# Altium footprint library Cty1.PcbLib: 870 footprints (part 40 of 55)
Each footprint in its own frame and in the unit in brackets; x right, y up, seen from the top. Pads: shape width x height; smd on the part's side, far side on the other; paste and mask are expansions set on the pad; w line width, h text height; cw(c..) or ccw(c..) is an arc to the next point about the centre after c.
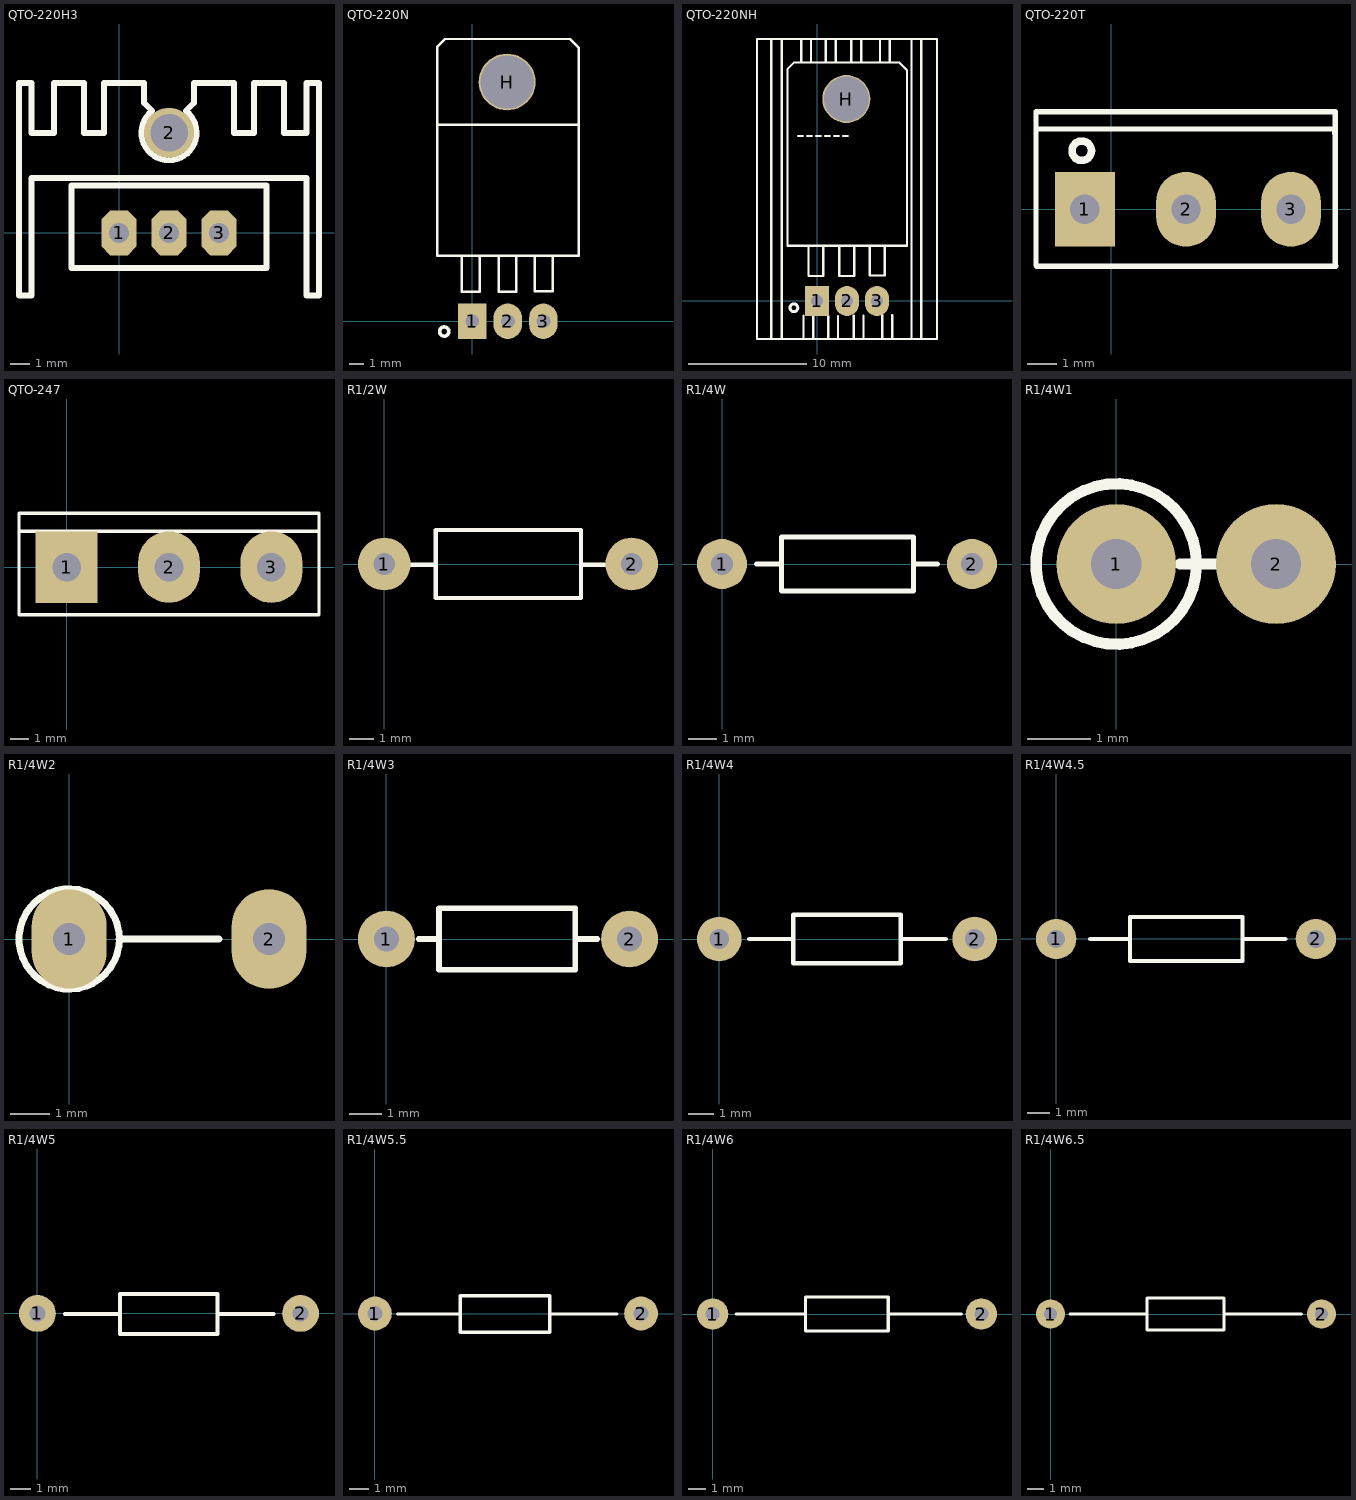
[diagram p39: the footprints below, top view; thin cyan lines are the x and y axes]

## QTO-220H3 [mil] "TO-220 1-2-3"
pads (4):
  oct 70x90 hole 40: 1(0,0) 2(100,0) 3(200,0)
  round 100 hole 75: 2(100,200)
Top Overlay:
  lines w12: 66,244 50,260 50,300 -30,300 -30,200 -70,200 -70,300 -130,300 -130,200 -175,200 -175,300 -200,300 -200,-125 -175,-125 -175,110 375,110 375,-125 400,-125 400,300 375,300 375,200 330,200 330,300 270,300 270,200 230,200 230,300 150,300 150,260 133.59,243.59 ; 66.37,243.52 ccw(c100,200) 133.77,243.41 ; -95,-70 -95,95 295,95 295,-70 -95,-70
3D body "SW3dPS-heatsink TO126.STEP": height 984.25, standoff -149.61, extent -189.97,-102.25 391.97,323
3D body "User Library-TO-220-1.STEP": height 322.83, standoff -810.24, extent -96.88,-76.17 292.88,101

## QTO-220N [mil] "TO-220 - 1-2-3"
height 200
pads (4):
  rect 80x100 hole 39: 1(0,0)
  oval 80x100 hole 39: 2(100,0) 3(200,0)
  round 160 hole 150: H(98,673)
Top Overlay:
  circle w10: c-79.03,-29 r12.97
  lines w7: -99,549 -99,772 -77,794 275,794 300,769 300,730 ; -99,552 -99,184 300,184 300,553 -98,553 ; -29,178 -29,83 21,83 21,180 20,181 ; 74,178 74,83 124,83 124,180 123,181 ; 176,180 176,85 226,85 226,182 225,183 ; 300,552 300,733
3D body "SW3dPS-mje-700 and 800.STEP": height 121, standoff -160, extent -48,-10.31 252,792.31

## QTO-220NH [mil] "TO-220 - 1-2-3"
height 200
pads (4):
  rect 80x100 hole 39: 1(0,0)
  oval 80x100 hole 39: 2(100,0) 3(200,0)
  round 160 hole 150: H(98,673)
Top Overlay:
  circle w10: c-77.03,-23 r12.97
  lines w7: -99,549 -99,772 -77,794 275,794 300,769 300,730 ; -99,552 -99,184 300,184 300,553 ; -29,178 -29,83 21,83 21,180 20,181 ; 74,178 74,83 124,83 124,180 123,181 ; 176,180 176,85 226,85 226,182 225,183 ; 300,552 300,733
  lines w8: -152,-127 -152,873 ; -117,-127 -117,873 ; -53,796 -53.01,869.97 ; -45,-124 -45.01,-50.03 ; -20,796 -20.01,869.97 ; -12,-124 -12.01,-50.03 ; 29,795 28.99,868.97 ; 37,-125 36.99,-51.03 ; 62,795 61.99,868.97 ; 70,-125 69.99,-51.03 ; 114,796 113.99,869.97 ; 122,-124 121.99,-50.03 ; 147,796 146.99,869.97 ; 155,-124 154.99,-50.03 ; 210,798 209.99,871.97 ; 218,-122 217.99,-48.03 ; 243,798 242.99,871.97 ; 251,-122 250.99,-48.03 ; 315,-127 315,873 ; 348,-127 348,873 ; -200,-127 400,-127 400,873 -200,873 -200,-127
  text "------" at -69,527 h60
3D body "SW3DPS-TO-220-DEFAULT.STEP": height 165.35, standoff -118.11, extent -100,-3.66 300,763.66

## QTO-220T [mil] "TO-220 - 1-2-3"
height 200
pads (3):
  rect 80x100 hole 39: 1(-35,0)
  oval 80x100 hole 39: 2(100,0) 3(240,0)
Top Overlay:
  circle w10: c-38.97,78 r12.97
  lines w7: -100,107 298,107 299,93 ; -100,-75 -99,-76 -76,-76 300,-76 299,-75 299,130 -100,130 -100,-75
3D body "SW3dPS-Transistor TO 220.STEP": height 622.65, standoff -393.1, extent -103.76,-69 301.76,108.16

## QTO-247 [mil] "TO-247"
height 200
pads (3):
  rect 130x150 hole 60: 1(0,0)
  oval 130x150 hole 60: 2(215,0) 3(430,0)
Top Overlay:
  lines w7: -100,75 529,75 ; -100,-100 -100,113 530,113 530,-100 -100,-100
3D body "SW3dPS-TO-247.STEP": height 940.6, standoff -479.4, extent -89,-78 511,102

## R1/2W [mil] "R 1/2W, 2 pin, 300mil"
height 100
pads (2):
  round 85 hole 35: 1(0,0) 2(400,0)
Top Overlay:
  lines w7: 42,-1 83,-1 ; 318,-1 356,-1 ; 83,-55 318,-55 318,55 83,55 83,-55
3D body "SW3dPS-AXIAL_RESISTOR(0.25W).STEP": height 91.42, standoff -70, extent -11.6,-45.49 413.6,49

## R1/4W [mil] "R 1/4W, 2 Pin, 350mil"
height 100
pads (2):
  round 70 hole 31: 1(0,0) 2(350,0)
Top Overlay:
  lines w7: 48,0 83,0 ; 268,0 302,0 ; 83,-38 83,38 268,38 268,-38 83,-38

## R1/4W1 [mm] "R 1/4W, 2 Pin, 150mil"
height 2.54
pads (2):
  round 1.905 hole 0.8: 1(0,0) 2(2.54,0)
Top Overlay:
  circle w0.178: c0,0 r1.276
  lines w0.178: 1.016,0 1.651,0
3D body "SW3dPS-Res_Stand.STEP": height 7.3, standoff -1.45, extent -0.889,-0.92 2.823,0.92

## R1/4W2 [mil] "R 1/4W, 2 Pin, 200mil"
height 100
pads (2):
  oval 75x100 hole 32: 1(0,0) 2(200,0)
Top Overlay:
  circle w7: c0,0 r50.25
  lines w7: 50,0 150,0

## R1/4W3 [mil] "R 1/4W, 2 Pin, 350mil"
height 100
pads (2):
  round 70 hole 31: 1(0,0) 2(300,0)
Top Overlay:
  lines w7: 40,0 65,0 ; 233,0 260,0 ; 65,-38 65,38 233,38 233,-38 65,-38

## R1/4W4 [mil] "R 1/4W, 2 Pin, 400mil"
height 100
pads (2):
  round 70 hole 31: 1(0,0) 2(400,0)
Top Overlay:
  lines w7: 47,0 116,0 ; 284,0 355,0 ; 116,-38 284,-38 284,38 116,38 116,-38

## R1/4W4.5 [mil] "R 1/4W, 2 Pin, 450mil"
height 100
pads (2):
  round 70 hole 31: 1(0,0) 2(450,0)
Top Overlay:
  lines w7: 59,0 128,0 ; 326,0 397,0 ; 128,-38 128,38 323,38 323,-38 128,-38

## R1/4W5 [mil] "R 1/4W, 2 Pin, 500mil"
height 100
pads (2):
  round 70 hole 31: 1(0,0) 2(500,0)
Top Overlay:
  lines w7: 52,-1 157,-1 ; 342,-1 449,-1 ; 157,-39 157,37 342,37 342,-39 157,-39

## R1/4W5.5 [mil] "R 1/4W, 2 Pin, 550mil"
height 100
pads (2):
  round 70 hole 31: 1(0,0) 2(550,0)
Top Overlay:
  lines w7: 47,-1 176,-1 ; 361,-1 500,-1 ; 176,-39 361,-39 361,37 176,37 176,-39

## R1/4W6 [mil] "R 1/4W, 2 Pin, 600mil"
height 100
pads (2):
  round 70 hole 31: 1(0,0) 2(600,0)
Top Overlay:
  lines w7: 52,0 207,0 ; 392,0 556,0 ; 207,-38 392,-38 392,38 207,38 207,-38

## R1/4W6.5 [mil] "R 1/4W, 2 Pin, 650mil"
height 100
pads (2):
  round 70 hole 31: 1(0,0) 2(650,0)
Top Overlay:
  lines w7: 47,0 231,0 ; 416,0 602,0 ; 231,-38 231,38 416,38 416,-38 231,-38